# Altium footprint library 封装库.PcbLib: 755 footprints (part 39 of 48)
Each footprint in its own frame and in the unit in brackets; x right, y up, seen from the top. Pads: shape width x height; smd on the part's side, far side on the other; paste and mask are expansions set on the pad; w line width, h text height; cw(c..) or ccw(c..) is an arc to the next point about the centre after c.
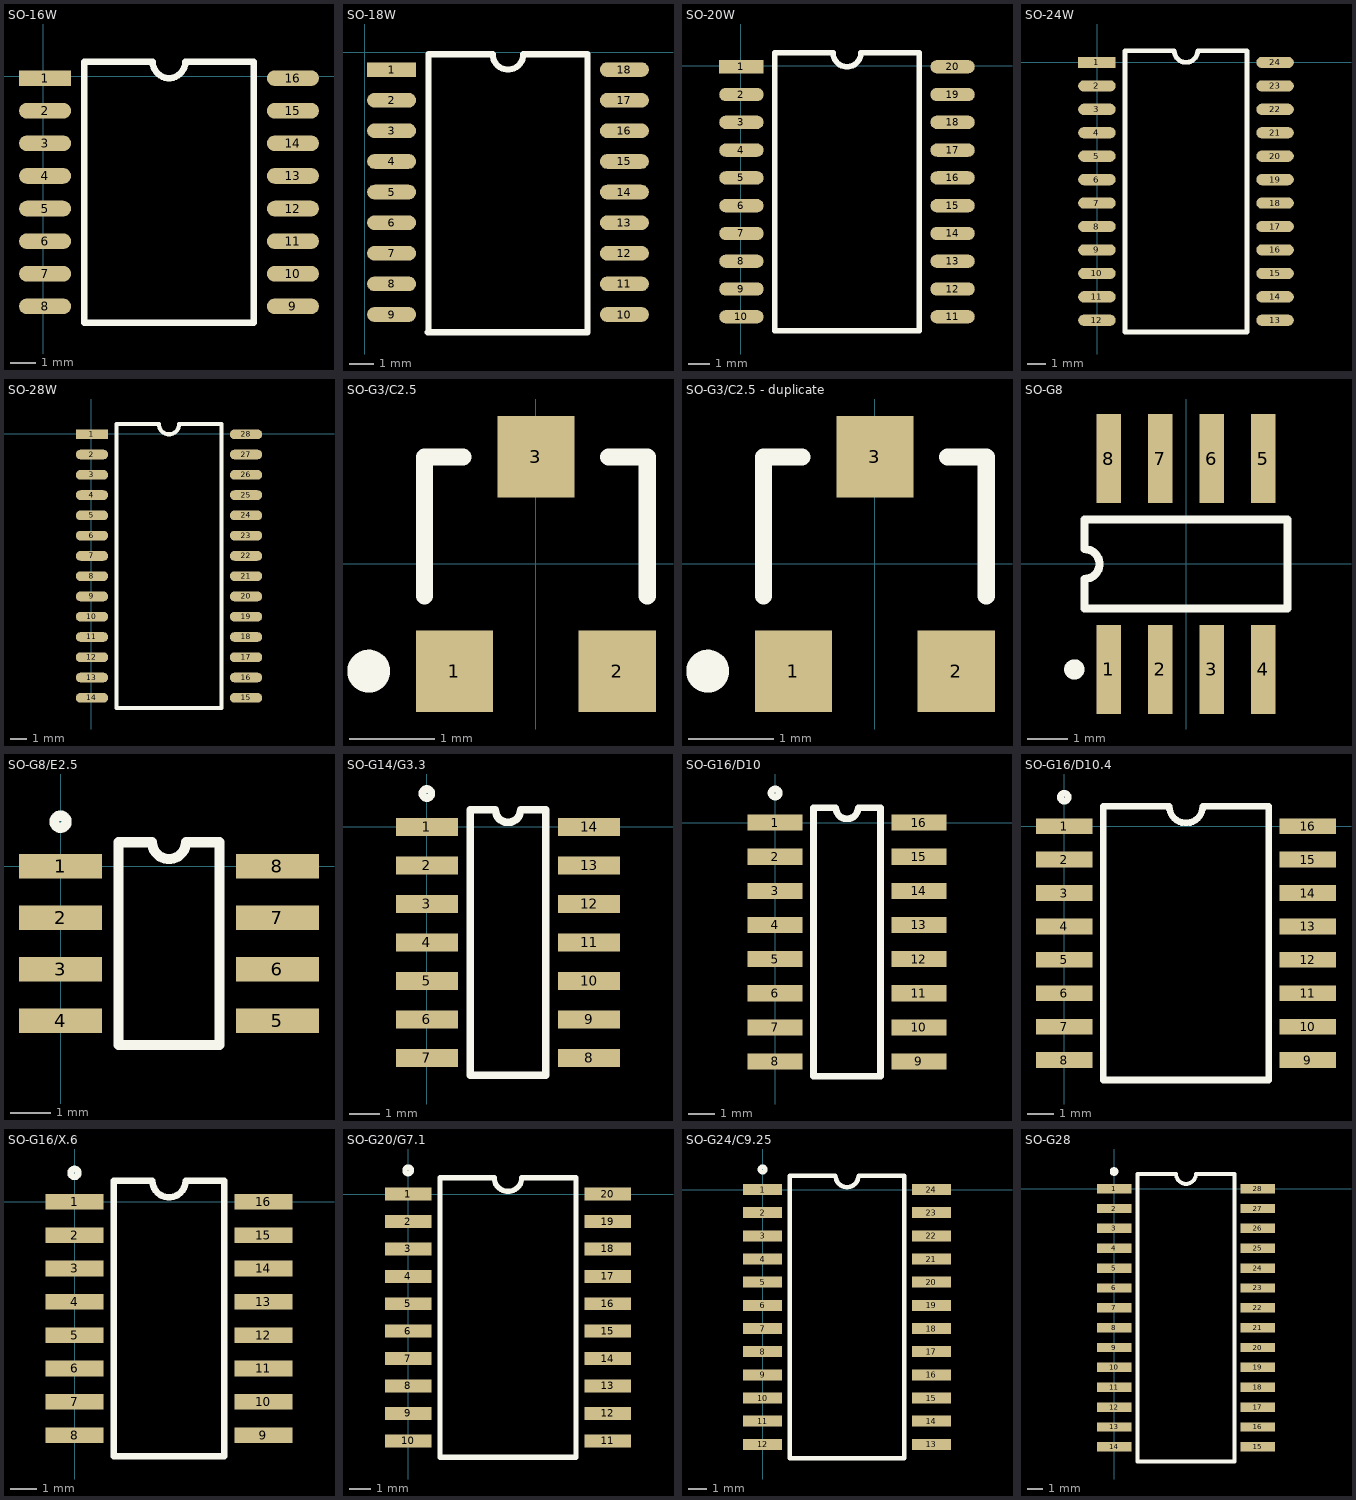
[diagram p38: the footprints below, top view; thin cyan lines are the x and y axes]

## SO-16W [mil]
pads (16):
  rect 80x24 smd: 1(3,-3)
  oval 80x24 smd: 2(3,-53) 3(3,-103) 4(3,-153) 5(3,-203) 6(3,-253) 7(3,-303) 8(3,-353) 9(383,-353) 10(383,-303) 11(383,-253) 12(383,-203) 13(383,-153) 14(383,-103) 15(383,-53) 16(383,-3)
Top Overlay:
  lines w10: 167.72,22 63,22 63,-378 323,-378 323,22 218,22 cw(c193,22) 168,22

## SO-18W [mil]
pads (18):
  rect 80x24 smd: 1(44,-28)
  oval 80x24 smd: 2(44,-78) 3(44,-128) 4(44,-178) 5(44,-228) 6(44,-278) 7(44,-328) 8(44,-378) 9(44,-428) 10(424,-428) 11(424,-378) 12(424,-328) 13(424,-278) 14(424,-228) 15(424,-178) 16(424,-128) 17(424,-78) 18(424,-28)
Top Overlay:
  lines w10: 103,-457 363,-457 ; 104,-457 104,-3 209,-3 ccw(c234,-3) 259,-3 364,-3 364,-457

## SO-20W [mil]
pads (20):
  rect 80x24 smd: 1(1,-2)
  oval 80x24 smd: 2(1,-52) 3(1,-102) 4(1,-152) 5(1,-202) 6(1,-252) 7(1,-302) 8(1,-352) 9(1,-402) 10(1,-452) 11(381,-452) 12(381,-402) 13(381,-352) 14(381,-302) 15(381,-252) 16(381,-202) 17(381,-152) 18(381,-102) 19(381,-52) 20(381,-2)
Top Overlay:
  lines w10: 61,-477 61,23 166,23 ccw(c191,23) 216,23 321,23 321,-477 61,-477

## SO-24W [mil]
pads (24):
  rect 80x24 smd: 1(-1,0)
  oval 80x24 smd: 2(-1,-50) 3(-1,-100) 4(-1,-150) 5(-1,-200) 6(-1,-250) 7(-1,-300) 8(-1,-350) 9(-1,-400) 10(-1,-450) 11(-1,-500) 12(-1,-550) 13(379,-550) 14(379,-500) 15(379,-450) 16(379,-400) 17(379,-350) 18(379,-300) 19(379,-250) 20(379,-200) 21(379,-150) 22(379,-100) 23(379,-50) 24(379,0)
Top Overlay:
  lines w10: 59,-575 59,25 164,25 ccw(c189,25) 214,25 319,25 319,-575 59,-575

## SO-28W [mil]
pads (28):
  rect 80x24 smd: 1(2,-1)
  oval 80x24 smd: 2(2,-51) 3(2,-101) 4(2,-151) 5(2,-201) 6(2,-251) 7(2,-301) 8(2,-351) 9(2,-401) 10(2,-451) 11(2,-501) 12(2,-551) 13(2,-601) 14(2,-651) 15(382,-651) 16(382,-601) 17(382,-551) 18(382,-501) 19(382,-451) 20(382,-401) 21(382,-351) 22(382,-301) 23(382,-251) 24(382,-201) 25(382,-151) 26(382,-101) 27(382,-51) 28(382,-1)
Top Overlay:
  lines w10: 62,-676 322,-676 322,24 217,24 cw(c192,24) 167,24 62,24 62,-676

## SO-G3/C2.5 [mm] "SOT-23; 3 Leads; Body 3.0 x 2.6 mm, inc. leads (LxW max)"
pads (3):
  rect 0.9x0.95 smd: 1(-0.95,-1.25) 2(0.95,-1.25) 3(0,1.25)
Top Overlay:
  circle w0.25: c-1.95,-1.25 r0.125
  lines w0.2: -1.3,-0.375 -1.3,1.25 -0.85,1.25 ; 0.85,1.25 1.3,1.25 1.3,-0.375

## SO-G3/C2.5 - duplicate [mm] "SOT-23; 3 Leads; Body 3.0 x 2.6 mm, inc. leads (LxW max)"
pads (3):
  rect 0.9x0.95 smd: 1(-0.95,-1.25) 2(0.95,-1.25) 3(0,1.25)
Top Overlay:
  circle w0.25: c-1.95,-1.25 r0.125
  lines w0.2: -1.3,-0.375 -1.3,1.25 -0.85,1.25 ; 0.85,1.25 1.3,1.25 1.3,-0.375

## SO-G8 [mm] "Small Outline; 8 Leads; Body Width 3.9 mm; Pitch 1.27 mm"
height 1.75
pads (8):
  rect 0.6x2.2 smd: 1(-1.905,-2.6) 2(-0.635,-2.6) 3(0.635,-2.6) 4(1.905,-2.6) 5(1.905,2.6) 6(0.635,2.6) 7(-0.635,2.6) 8(-1.905,2.6)
Top Overlay:
  circle w0.25: c-2.755,-2.6 r0.125
  lines w0.2: -2.5,-0.367 -2.5,-1.1 2.5,-1.1 2.5,1.1 -2.5,1.1 -2.5,0.367 ; -2.5,-0.367 ccw(c-2.5,0) -2.5,0.367

## SO-G8/E2.5 [mm]
pads (8):
  rect 2.05x0.6 smd: 1(0,0) 2(0,-1.27) 3(0,-2.54) 4(0,-3.81) 5(5.35,-3.81) 6(5.35,-2.54) 7(5.35,-1.27) 8(5.35,0)
Top Overlay:
  circle w0.25: c0,1.1 r0.15
  lines w0.25: 2.258,0.595 1.425,0.595 1.425,-4.405 3.925,-4.405 3.925,0.595 3.092,0.595 cw(c2.675,0.595) 2.258,0.595

## SO-G14/G3.3 [mm]
pads (14):
  rect 2.05x0.6 smd: 1(0,0) 2(0,-1.27) 3(0,-2.54) 4(0,-3.81) 5(0,-5.08) 6(0,-6.35) 7(0,-7.62) 8(5.35,-7.62) 9(5.35,-6.35) 10(5.35,-5.08) 11(5.35,-3.81) 12(5.35,-2.54) 13(5.35,-1.27) 14(5.35,0)
Top Overlay:
  circle w0.25: c0,1.1 r0.15
  lines w0.25: 1.425,-8.185 3.925,-8.185 3.925,0.565 3.092,0.565 cw(c2.675,0.565) 2.258,0.565 1.425,0.565 1.425,-8.185

## SO-G16/D10 [mm]
pads (16):
  rect 2.05x0.6 smd: 1(0,0) 2(0,-1.27) 3(0,-2.54) 4(0,-3.81) 5(0,-5.08) 6(0,-6.35) 7(0,-7.62) 8(0,-8.89) 9(5.35,-8.89) 10(5.35,-7.62) 11(5.35,-6.35) 12(5.35,-5.08) 13(5.35,-3.81) 14(5.35,-2.54) 15(5.35,-1.27) 16(5.35,0)
Top Overlay:
  circle w0.25: c0,1.1 r0.15
  lines w0.25: 1.425,-9.445 1.425,0.555 2.258,0.555 ccw(c2.675,0.555) 3.092,0.555 3.925,0.555 3.925,-9.445 1.425,-9.445

## SO-G16/D10.4 [mm]
pads (16):
  rect 2.15x0.6 smd: 1(0,0) 2(0,-1.27) 3(0,-2.54) 4(0,-3.81) 5(0,-5.08) 6(0,-6.35) 7(0,-7.62) 8(0,-8.89) 9(9.25,-8.89) 10(9.25,-7.62) 11(9.25,-6.35) 12(9.25,-5.08) 13(9.25,-3.81) 14(9.25,-2.54) 15(9.25,-1.27) 16(9.25,0)
Top Overlay:
  circle w0.25: c0,1.1 r0.15
  lines w0.25: 1.475,-9.645 7.775,-9.645 7.775,0.755 5.26,0.755 cw(c4.625,0.755) 3.99,0.755 1.475,0.755 1.475,-9.645

## SO-G16/X.6 [mm]
pads (16):
  rect 2.2x0.6 smd: 1(0,0) 2(0,-1.27) 3(0,-2.54) 4(0,-3.81) 5(0,-5.08) 6(0,-6.35) 7(0,-7.62) 8(0,-8.89) 9(7.2,-8.89) 10(7.2,-7.62) 11(7.2,-6.35) 12(7.2,-5.08) 13(7.2,-3.81) 14(7.2,-2.54) 15(7.2,-1.27) 16(7.2,0)
Top Overlay:
  circle w0.25: c0,1.1 r0.15
  lines w0.25: 1.5,-9.695 1.5,0.805 2.965,0.805 ccw(c3.6,0.805) 4.235,0.805 5.7,0.805 5.7,-9.695 1.5,-9.695

## SO-G20/G7.1 [mm]
pads (20):
  rect 2.15x0.6 smd: 1(0,0) 2(0,-1.27) 3(0,-2.54) 4(0,-3.81) 5(0,-5.08) 6(0,-6.35) 7(0,-7.62) 8(0,-8.89) 9(0,-10.16) 10(0,-11.43) 11(9.25,-11.43) 12(9.25,-10.16) 13(9.25,-8.89) 14(9.25,-7.62) 15(9.25,-6.35) 16(9.25,-5.08) 17(9.25,-3.81) 18(9.25,-2.54) 19(9.25,-1.27) 20(9.25,0)
Top Overlay:
  circle w0.25: c0,1.1 r0.15
  lines w0.25: 1.475,-12.19 7.775,-12.19 7.775,0.76 5.26,0.76 cw(c4.625,0.76) 3.99,0.76 1.475,0.76 1.475,-12.19

## SO-G24/C9.25 [mm]
pads (24):
  rect 2.15x0.6 smd: 1(0,0) 2(0,-1.27) 3(0,-2.54) 4(0,-3.81) 5(0,-5.08) 6(0,-6.35) 7(0,-7.62) 8(0,-8.89) 9(0,-10.16) 10(0,-11.43) 11(0,-12.7) 12(0,-13.97) 13(9.25,-13.97) 14(9.25,-12.7) 15(9.25,-11.43) 16(9.25,-10.16) 17(9.25,-8.89) 18(9.25,-7.62) 19(9.25,-6.35) 20(9.25,-5.08) 21(9.25,-3.81) 22(9.25,-2.54) 23(9.25,-1.27) 24(9.25,0)
Top Overlay:
  circle w0.25: c0,1.1 r0.15
  lines w0.25: 1.475,-14.735 1.475,0.765 3.99,0.765 ccw(c4.625,0.765) 5.26,0.765 7.775,0.765 7.775,-14.735 1.475,-14.735

## SO-G28 [mm]
pads (28):
  rect 2.2x0.6 smd: 1(0,0) 2(0,-1.27) 3(0,-2.54) 4(0,-3.81) 5(0,-5.08) 6(0,-6.35) 7(0,-7.62) 8(0,-8.89) 9(0,-10.16) 10(0,-11.43) 11(0,-12.7) 12(0,-13.97) 13(0,-15.24) 14(0,-16.51) 15(9.2,-16.51) 16(9.2,-15.24) 17(9.2,-13.97) 18(9.2,-12.7) 19(9.2,-11.43) 20(9.2,-10.16) 21(9.2,-8.89) 22(9.2,-7.62) 23(9.2,-6.35) 24(9.2,-5.08) 25(9.2,-3.81) 26(9.2,-2.54) 27(9.2,-1.27) 28(9.2,0)
Top Overlay:
  circle w0.25: c0,1.1 r0.15
  lines w0.25: 1.5,-17.455 1.5,0.945 3.965,0.945 ccw(c4.6,0.945) 5.235,0.945 7.7,0.945 7.7,-17.455 1.5,-17.455